# Altium footprint library HamedLib.PcbLib: 221 footprints (part 3 of 14)
Each footprint in its own frame and in the unit in brackets; x right, y up, seen from the top. Pads: shape width x height; smd on the part's side, far side on the other; paste and mask are expansions set on the pad; w line width, h text height; cw(c..) or ccw(c..) is an arc to the next point about the centre after c.
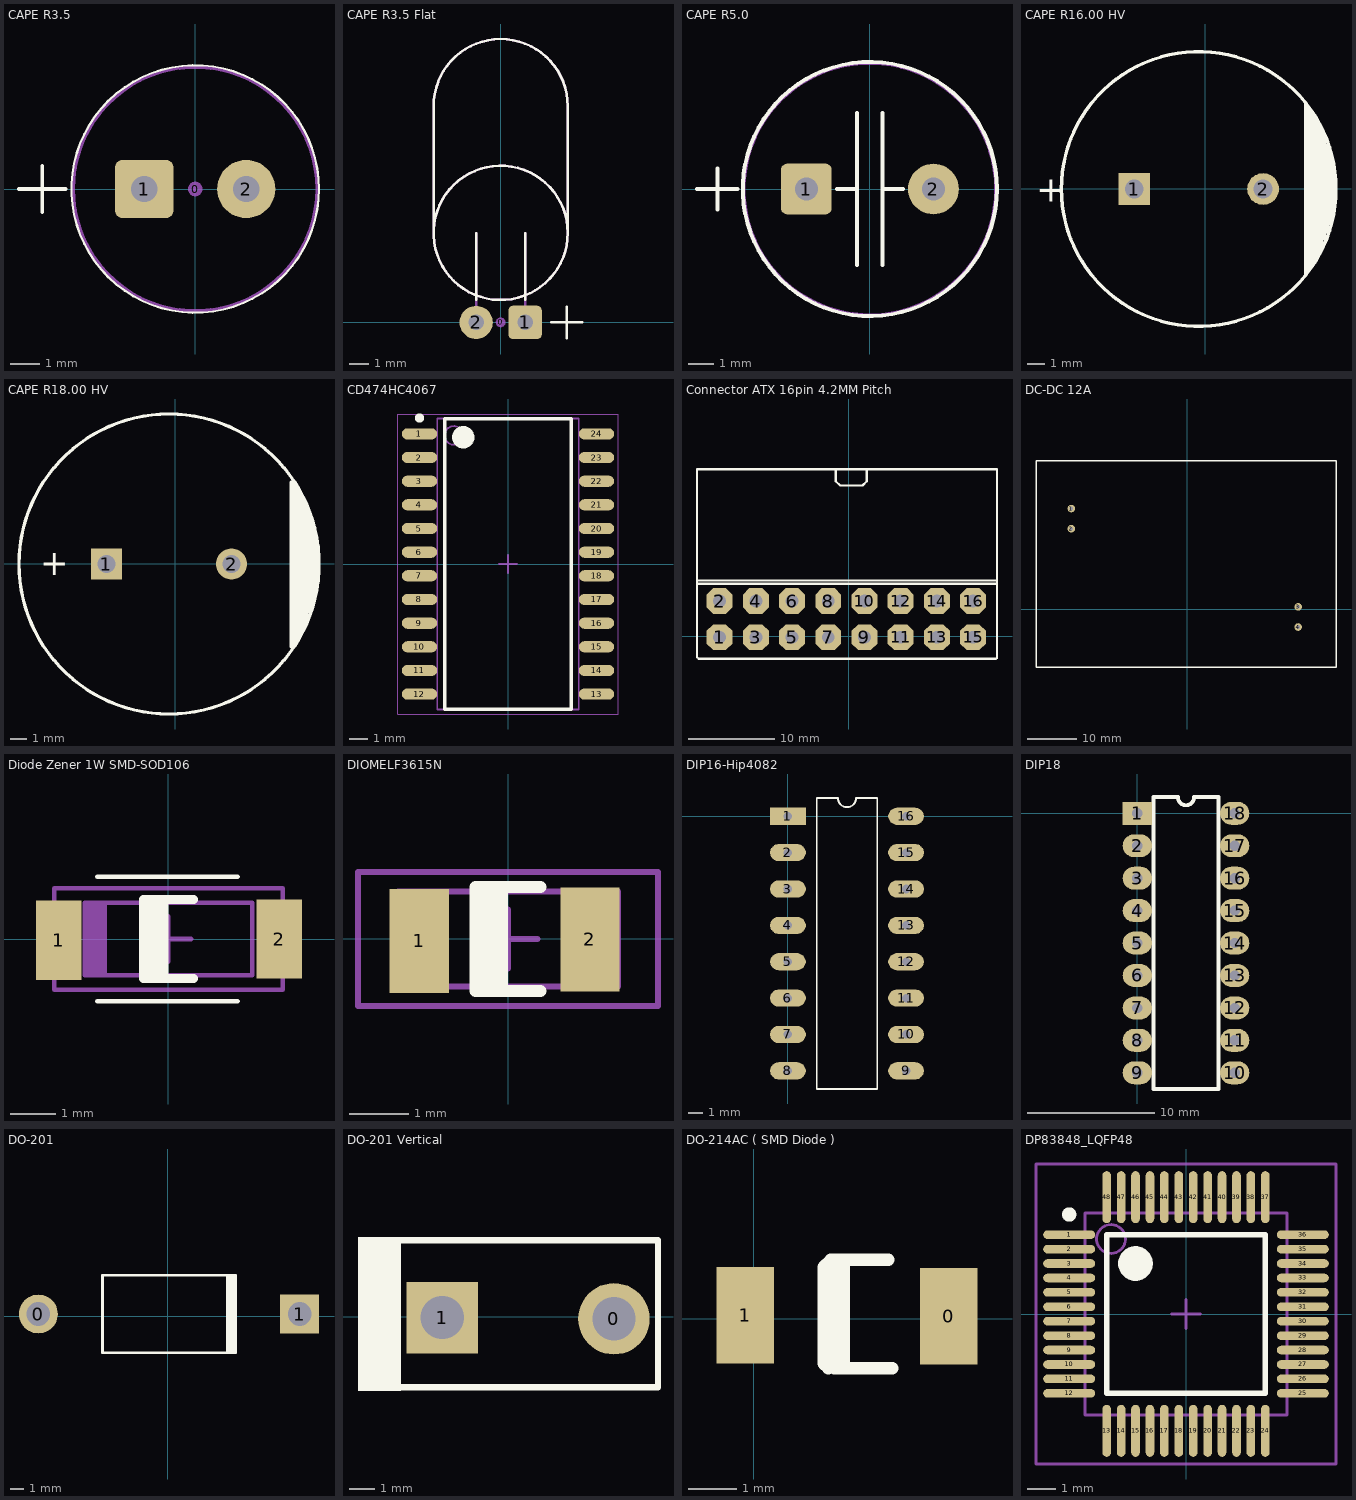
[diagram p2: the footprints below, top view; thin cyan lines are the x and y axes]

## CAPE R3.5 [mm]
pads (3):
  round 0.508 on Mech15: 0(0,0)
  rrect25% 2x2 hole 0.9: 1(-1.75,0)
  round 2 hole 0.9: 2(1.75,0)
Top Overlay:
  circle w0.076: c0,0 r4.25
  lines w0.127: -6.05,0 -4.45,0 ; -5.25,-0.8 -5.25,0.8
Mechanical 13:
  circle w0.127: c0,0 r4.191
3D body: height 7.1, standoff 0.1, extent -4.25,-4.25 4.216,4.233

## CAPE R3.5 Flat [mm]
height 6.8
pads (3):
  round 0.508 on Mech15: 0(0,0)
  rrect25% 1.7x1.7 hole 0.8: 1(1.25,0)
  round 1.7 hole 0.8: 2(-1.25,0)
Top Overlay:
  circle w0.127: c0,4.572 r3.429
  lines w0.127: -3.429,4.572 -3.429,11.049 cw(c0,11.049) 3.429,11.049 3.429,4.572 ; -1.25,1.143 -1.25,4.552 ; 1.25,1.143 1.25,4.552 ; 2.58,0 4.18,0 ; 3.38,-0.8 3.38,0.8
Mechanical 13:
  circle w0.127: c0,4.572 r3.429
  lines w0.127: -3.429,4.572 -3.429,11.049 cw(c0,11.049) 3.429,11.049 3.429,4.572 ; -1.25,0 -1.25,4.552 ; 1.25,0 1.25,4.552
3D body "CAPAE250P680X1220_FLAT2.STEP": height 6.77, standoff -1.78, extent -3.371,-0.249 3.372,12.952

## CAPE R5.0 [mm]
height 20
pads (2):
  rrect25% 2x2 hole 0.9: 1(-2.5,0)
  round 2 hole 0.9: 2(2.5,0)
Top Overlay:
  circle w0.152: c0,0 r5
  lines w0.152: -6.8,0 -5.2,0 ; -6,-0.8 -6,0.8 ; -1.3,0 -0.5,0 ; -0.5,-3 -0.5,3 ; 0.5,-3 0.5,3 ; 0.5,0 1.3,0
Mechanical 13:
  circle w0.127: c0,-0.003 r4.953
3D body "ElectroCap20x10mm.stp": height 20, standoff -3.5, extent -4.958,-4.968 4.953,4.961

## CAPE R16.00 HV [mm]
pads (2):
  rect 1.85x1.85 hole 1.1: 1(-4.132,-0.015)
  round 1.85 hole 1.1: 2(3.368,-0.015)
Top Overlay:
  circle w0.2: c-0.382,-0.015 r8
  lines w0.2: 5.85,-5 5.85,4.9 5.975,4.775 5.975,-4.8 6.05,-4.725 6.05,4.65 6.175,4.525 6.175,-4.525 6.275,-4.425 6.275,4.275 ; 6.425,-4.175 6.425,4.05 ; 6.575,-3.925 6.575,3.825 ; 6.65,-3.6 6.65,3.675 ; 6.75,-3.3 6.75,3.475 ; 6.8,-3.125 6.8,3.15 ; 6.95,-2.925 6.95,3.1 ; 7.1,-2.55 7.1,2.575 ; 7.275,-2.05 7.275,2.15 ; 7.375,-1.5 7.375,1.425 ; 7.475,-1.05 7.475,1.05
  text "+" at -9.857,-0.765 h1.5
3D body "User Library-16mm Cap.step": height 25.03, standoff -1.5, extent -8.35,-8.05 7.68,7.95

## CAPE R18.00 HV [mm]
height 42
pads (2):
  rect 1.85x1.85 hole 1.1: 1(-4.132,-0.015)
  round 1.85 hole 1.1: 2(3.368,-0.015)
Top Overlay:
  circle w0.2: c-0.382,-0.015 r9
  lines w0.2: 6.95,-5 6.95,4.9 7.075,4.775 7.075,-4.8 7.15,-4.725 7.15,4.65 7.275,4.525 7.275,-4.525 7.375,-4.425 7.375,4.275 ; 7.525,-4.175 7.525,4.05 ; 7.675,-3.925 7.675,3.825 ; 7.75,-3.6 7.75,3.675 ; 7.85,-3.3 7.85,3.475 ; 7.9,-3.125 7.9,3.15 ; 8.05,-2.925 8.05,3.1 ; 8.2,-2.55 8.2,2.575 ; 8.375,-2.05 8.375,2.15 ; 8.475,-1.5 8.475,1.425 ; 8.575,-1.05 8.575,1.05
  text "+" at -8.1,-0.7 h1.5
3D body "User Library-CE_R300_D720_H1600.step": height 41.36, standoff -2.78, extent -9.54,-9.038 8.74,9.238

## CD474HC4067 [mm]
height 2.65
pads (24):
  oval 1.9x0.6 smd: 1(-4.75,6.985) 2(-4.75,5.715) 3(-4.75,4.445) 4(-4.75,3.175) 5(-4.75,1.905) 6(-4.75,0.635) 7(-4.75,-0.635) 8(-4.75,-1.905) 9(-4.75,-3.175) 10(-4.75,-4.445) 11(-4.75,-5.715) 12(-4.75,-6.985) 13(4.75,-6.985) 14(4.75,-5.715) 15(4.75,-4.445) 16(4.75,-3.175) 17(4.75,-1.905) 18(4.75,-0.635) 19(4.75,0.635) 20(4.75,1.905) 21(4.75,3.175) 22(4.75,4.445) 23(4.75,5.715) 24(4.75,6.985)
Top Overlay:
  circle w0.6: c-2.4,6.8 r0.3
  circle w0.25: c-4.75,7.835 r0.125
  lines w0.2: -3.4,-7.8 3.4,-7.8 3.4,7.8 -3.4,7.8 -3.4,-7.8
Mechanical 13:
  circle w0.1: c-2.9,6.9 r0.5
  lines w0.1: -3.8,-7.8 3.8,-7.8 3.8,7.8 -3.8,7.8 -3.8,-7.8
Mechanical 15:
  lines w0.05: -5.925,-8.05 5.925,-8.05 5.925,8.05 -5.925,8.05 -5.925,-8.05
  lines w0.1: -0.5,0 0.5,0 ; 0,-0.5 0,0.5
3D body "CD474HC4067.step": height 2.65, standoff 0, extent -5.15,-7.8 5.15,7.8

## Connector ATX 16pin 4.2MM Pitch [mm]
pads (16):
  oct 3x3 hole 1.5: 1(-14.975,-0.1) 2(-14.975,4.1) 3(-10.775,-0.1) 4(-10.775,4.1) 5(-6.575,-0.1) 6(-6.575,4.1) 7(-2.375,-0.1) 8(-2.375,4.1) 9(1.825,-0.1) 10(1.825,4.1) 11(6.025,-0.1) 12(6.025,4.1) 13(10.225,-0.1) 14(10.225,4.1) 15(14.425,-0.1) 16(14.425,4.1)
Top Overlay:
  lines w0.254: -17.6,5.8 -17.6,6.4 -17.5,6.5 17.2,6.5 17.2,6 ; -17.6,6 -17.6,19.4 17.2,19.4 17.2,6.3 ; -1.5,19.4 -1.5,18 -1,17.5 1.6,17.5 2.1,18 2.1,19.3 ; -17.6,-2.4 -17.6,6.1 17.2,6.1 17.2,-2.5 17.1,-2.6 -17.4,-2.6 -17.6,-2.4

## DC-DC 12A [mil]
pads (4):
  round 60 hole 30: 1(-920,800) 2(-920,640) 3(880,20) 4(880,-140)
Top Overlay:
  lines w10: -1200,-460 1180,-460 1180,1180 -1200,1180 -1200,-460
3D body "DC to DC.STEP": height 692.91, standoff -149.61, extent -1180,-604.25 1182.2,1364.25

## Diode Zener 1W SMD-SOD106 [mm] "MELF Diode, 2-Leads, Body 3.6x1.5mm, IPC Medium Density"
height 1.6
pads (2):
  rect 1x1.75 smd: 1(-2.425,-0.025) 2(2.45,0)
Top Overlay:
  rectangle: -0.55,-0.875 0,0.875
  lines w0.1: -1.575,-1.375 1.525,-1.375 ; -1.575,1.375 1.525,1.375
  lines w0.2: 0.55,-0.875 -0.55,-0.875 -0.55,0.875 0.55,0.875
Mechanical 13:
  rectangle: -1.85,-0.8 -1.352,0.8
  lines w0.1: -1.85,-0.8 1.85,-0.8 1.85,0.8 -1.85,0.8 -1.85,-0.8
Mechanical 15:
  lines w0.1: -0.5,0 0.5,0 ; 0,-0.5 0,0.5 ; -2.525,-1.125 2.525,-1.125 2.525,1.125 -2.525,1.125 -2.525,-1.125
3D body "Diode Zener 1W - SOD-106.STEP": height 2, standoff 0, extent -2.475,-1.311 2.525,1.289

## DIOMELF3615N [mm] "MELF Diode, 2-Leads, Body 3.6x1.5mm, IPC Medium Density"
height 1.6
pads (2):
  rect 1x1.75 smd: 1(-1.495,-0.03) 2(1.38,-0.005)
Top Overlay:
  rectangle: -0.55,-0.875 0,0.875
  lines w0.2: 0.55,-0.875 -0.55,-0.875 -0.55,0.875 0.55,0.875
Mechanical 13:
  rectangle: -1.85,-0.8 -1.352,0.8
  lines w0.1: -1.85,-0.8 1.85,-0.8 1.85,0.8 -1.85,0.8 -1.85,-0.8
Mechanical 15:
  lines w0.1: -0.5,0 0.5,0 ; 0,-0.5 0,0.5 ; -2.525,-1.125 2.525,-1.125 2.525,1.125 -2.525,1.125 -2.525,-1.125
3D body "Melf Zener Diode.STEP": height 1.45, standoff -0.05, extent -1.61,-0.83 1.54,0.67

## DIP16-Hip4082 [mm]
pads (16):
  rect 2.5x1.2 hole 0.6: 1(0,0)
  oval 2.5x1.2 hole 0.6: 2(0,-2.54) 3(0,-5.08) 4(0,-7.62) 5(0,-10.16) 6(0,-12.7) 7(0,-15.24) 8(0,-17.78) 9(8.25,-17.78) 10(8.25,-15.24) 11(8.25,-12.7) 12(8.25,-10.16) 13(8.25,-7.62) 14(8.25,-5.08) 15(8.25,-2.54) 16(8.25,0)
Top Overlay:
  lines w0.13: 2.015,-19.05 2.015,1.27 3.49,1.27 ccw(c4.125,1.27) 4.76,1.27 6.235,1.27 6.235,-19.05 2.015,-19.05
3D body "CircuitWorks-DIP16.step": height 4.19, standoff -2.57, extent 0.2,-19.62 8.074,1.97

## DIP18 [mm]
pads (18):
  rect 2.3x1.8 hole 0.8: 1(0,0)
  oval 2.3x1.8 hole 0.8: 2(0,-2.54) 3(0,-5.08) 4(0,-7.62) 5(0,-10.16) 6(0,-12.7) 7(0,-15.24) 8(0,-17.78) 9(0,-20.32) 10(7.62,-20.32) 11(7.62,-17.78) 12(7.62,-15.24) 13(7.62,-12.7) 14(7.62,-10.16) 15(7.62,-7.62) 16(7.62,-5.08) 17(7.62,-2.54) 18(7.62,0)
Top Overlay:
  lines w0.3: 1.27,-21.59 1.27,1.27 3.175,1.27 ccw(c3.81,1.27) 4.445,1.27 6.35,1.27 6.35,-21.59 1.27,-21.59
3D body "User Library-DIP18-300.step": height 5.08, standoff -2.49, extent -0.185,-21.67 7.685,1.32

## DO-201 [mm] "1n5822 Through Hole"
pads (2):
  round 2.8 hole 1.7: 0(-9.338,0.162)
  rect 2.8x2.8 hole 1.7: 1(9.502,0.162)
Top Overlay:
  rectangle: 4.182,-2.638 4.982,2.962
  lines w0.2: 4.882,-2.638 -4.718,-2.638 -4.718,2.962 4.882,2.962
3D body "User Library-DO-201ADDO-27.step": height 4.82, standoff -4.8, extent -10.14,-2.75 10,2.89

## DO-201 Vertical [mm] "1n5822 Through Hole"
pads (2):
  round 2.8 hole 1.7: 0(-2.525,-0.075)
  rect 2.8x2.8 hole 1.7: 1(-9.25,-0.025)
Top Overlay:
  rectangle: -12.55,-2.9 -10.875,3.125
  lines w0.2: -11.468,-2.638 -11.468,3
  lines w0.254: -11.5,-2.75 -0.8,-2.75 -0.8,3 -11.5,3
3D body "User Library-DO-201AV,Vertical.STEP": height 17.69, standoff -1, extent -11.69,-2.75 -1.8,2.85

## DO-214AC ( SMD Diode ) [mm]
pads (2):
  rect 1.2x2 smd: 0(4.05,0.05) 1(-0.175,0.075)
Top Overlay:
  lines w0.254: 1.55,-1.025 1.45,-0.925 1.45,1.075 1.6,1.225 ; 1.875,-0.9 1.875,1.125 ; 2.8,1.225 1.675,1.225 1.675,-1.025 2.875,-1.025
3D body "Diode SMD 1n4007-DO-214AC_SMA.step": height 2.15, standoff -0.05, extent -0.55,-1.275 4.45,1.425

## DP83848_LQFP48 [mm] "Thin QFP, 48-Leads, Body 7x7mm, Pitch 0.5mm, IPC Medium Density"
height 1.6
pads (48):
  oval 1.8x0.3 smd: 1(-4.05,2.75) 2(-4.05,2.25) 3(-4.05,1.75) 4(-4.05,1.25) 5(-4.05,0.75) 6(-4.05,0.25) 7(-4.05,-0.25) 8(-4.05,-0.75) 9(-4.05,-1.25) 10(-4.05,-1.75) 11(-4.05,-2.25) 12(-4.05,-2.75) 25(4.05,-2.75) 26(4.05,-2.25) 27(4.05,-1.75) 28(4.05,-1.25) 29(4.05,-0.75) 30(4.05,-0.25) 31(4.05,0.25) 32(4.05,0.75) 33(4.05,1.25) 34(4.05,1.75) 35(4.05,2.25) 36(4.05,2.75)
  oval 0.3x1.8 smd: 13(-2.75,-4.05) 14(-2.25,-4.05) 15(-1.75,-4.05) 16(-1.25,-4.05) 17(-0.75,-4.05) 18(-0.25,-4.05) 19(0.25,-4.05) 20(0.75,-4.05) 21(1.25,-4.05) 22(1.75,-4.05) 23(2.25,-4.05) 24(2.75,-4.05) 37(2.75,4.05) 38(2.25,4.05) 39(1.75,4.05) 40(1.25,4.05) 41(0.75,4.05) 42(0.25,4.05) 43(-0.25,4.05) 44(-0.75,4.05) 45(-1.25,4.05) 46(-1.75,4.05) 47(-2.25,4.05) 48(-2.75,4.05)
Top Overlay:
  circle w0.6: c-1.75,1.75 r0.3
  circle w0.25: c-4.05,3.45 r0.125
  lines w0.2: -2.75,-2.75 2.75,-2.75 2.75,2.75 -2.75,2.75 -2.75,-2.75
Mechanical 13:
  circle w0.1: c-2.6,2.6 r0.5
  lines w0.1: -3.5,-3.5 3.5,-3.5 3.5,3.5 -3.5,3.5 -3.5,-3.5
Mechanical 15:
  lines w0.1: -0.5,0 0.5,0 ; 0,-0.5 0,0.5 ; -5.2,-5.2 5.2,-5.2 5.2,5.2 -5.2,5.2 -5.2,-5.2
3D body "User Library-LQFP48_Grid_0_5.STEP": height 1.6, standoff 0, extent -4.5,-4.5 4.5,4.5